# Altium footprint library PBL - SMD Packages.PcbLib: 263 footprints (part 5 of 17)
Each footprint in its own frame and in the unit in brackets; x right, y up, seen from the top. Pads: shape width x height; smd on the part's side, far side on the other; paste and mask are expansions set on the pad; w line width, h text height; cw(c..) or ccw(c..) is an arc to the next point about the centre after c.
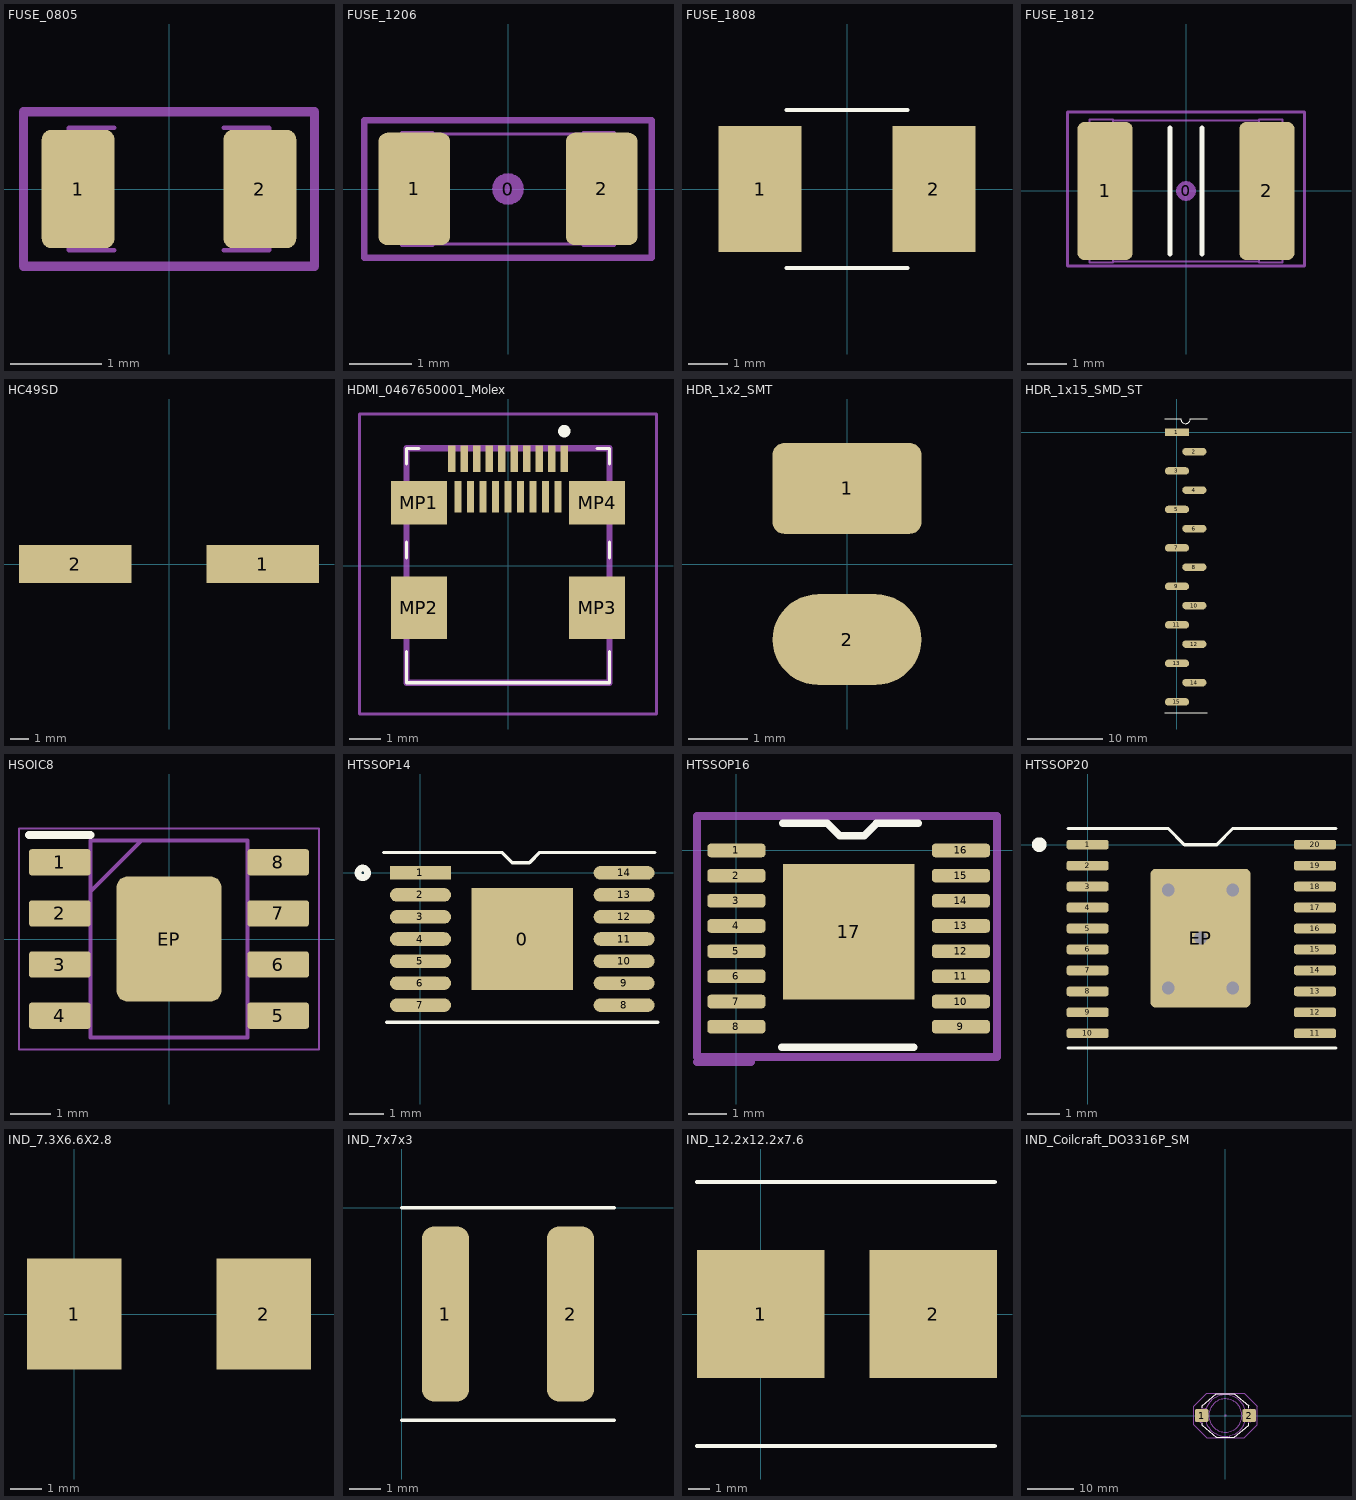
[diagram p4: the footprints below, top view; thin cyan lines are the x and y axes]

## FUSE_0805 [mm] "FUSE, Body 2.0x1.2mm, EIA 0805, IPC Medium Density"
height 0.7
pads (2):
  rrect25% 0.8x1.3 smd: 1(-1,0) 2(1,0)
13 - 3D Top Side:
  lines w0.05: -0.6,-0.675 -1.1,-0.675 -1.1,0.675 -0.6,0.675 ; 0.6,-0.675 1.1,-0.675 1.1,0.675 0.6,0.675
15 - Top Courtyards:
  lines w0.1: -1.6,-0.85 -1.6,0.85 1.6,0.85 1.6,-0.85 -1.6,-0.85

## FUSE_1206 [mm] "Fuse for 1206 package"
height 1
pads (3):
  round 0.508 on Mech15: 0(0,0)
  rrect25% 1.15x1.8 smd: 1(-1.5,0) 2(1.5,0)
13 - 3D Top Side:
  lines w0.05: -1.2,-0.88 1.2,-0.88 ; -1.2,0.88 1.2,0.88 ; -1.7,-0.9 -1.2,-0.9 -1.2,0.9 -1.7,0.9 -1.7,-0.9 ; 1.2,-0.9 1.7,-0.9 1.7,0.9 1.2,0.9 1.2,-0.9
15 - Top Courtyards:
  lines w0.1: -2.3,-1.1 -2.3,1.1 2.3,1.1 2.3,-1.1 -2.3,-1.1

## FUSE_1808 [mm]
pads (2):
  rect 2.1x3.2 smd: 1(-2.2,0) 2(2.2,0)
Top Overlay:
  lines w0.1: -1.53,-2 1.53,-2 ; -1.53,2 1.53,2
3D body "User Library-Fuse2.STEP": height 2.47, standoff -0.13, extent -3.05,-1.3 3.05,1.3

## FUSE_1812 [mm] "SMD Fuse 4.5x3.2mm, 1812"
height 2.8
pads (3):
  round 0.508 on Mech15: 0(0,0)
  rrect25% 1.4x3.5 smd: 1(-2.05,0) 2(2.05,0)
Top Overlay:
  lines w0.127: -0.4,-1.6 -0.4,1.6 ; 0.4,-1.6 0.4,1.6
13 - 3D Top Side:
  lines w0.05: -1.85,-1.791 1.85,-1.791 ; -1.85,1.791 1.85,1.791 ; -2.45,-1.811 -1.85,-1.811 -1.85,1.811 -2.45,1.811 -2.45,-1.811 ; 1.85,-1.811 1.85,1.811 2.45,1.811 2.45,-1.811 1.85,-1.811
15 - Top Courtyards:
  lines w0.076: -3,-1.9 3,-1.9 3,2 -3,2 -3,-1.9
3D body "User Library-Fuse 1812.step": height 1.03, standoff 0, extent -2.365,-1.74 2.37,1.74

## HC49SD [mm] "SMD scrystal"
pads (2):
  rect 6x2 smd: 1(5,0) 2(-5,0)

## HDMI_0467650001_Molex [mm] "hdmi connector SMD"
pads (23):
  rect 0.23x0.85 smd: 1(1.8,3.424) 3(1.4,3.424) 5(1,3.424) 7(0.6,3.424) 9(0.2,3.424) 11(-0.2,3.424) 13(-0.6,3.424) 15(-1,3.424) 17(-1.4,3.424) 19(-1.8,3.424)
  rect 0.23x1 smd: 2(1.6,2.199) 4(1.2,2.199) 6(0.8,2.199) 8(0.4,2.199) 10(0,2.199) 12(-0.4,2.199) 14(-0.8,2.199) 16(-1.2,2.199) 18(-1.6,2.199)
  rect 1.8x1.38 smd: MP1(-2.85,2.01) MP4(2.85,2.01)
  rect 1.8x2 smd: MP2(-2.85,-1.35) MP3(2.85,-1.35)
Top Overlay:
  lines w0.1: -3.25,-2.75 -3.25,-3.75 3.25,-3.75 3.25,-2.75 ; -3.25,0.25 -3.25,0.75 ; -3.25,3.25 -3.25,3.75 -2.85,3.75 ; 2.85,3.75 3.25,3.75 3.25,3.25 ; 3.25,0.25 3.25,0.75
  lines w0.2: 1.8,4.2 cw(c1.8,4.3) 1.8,4.4 cw(c1.8,4.3) 1.8,4.2
13 - 3D Top Side:
  lines w0.2: -3.25,-3.75 -3.25,3.75 3.25,3.75 3.25,-3.75 -3.25,-3.75
15 - Top Courtyards:
  lines w0.1: -4.75,-4.75 -4.75,4.849 4.75,4.849 4.75,-4.75 -4.75,-4.75
3D body "0467650001.stp": height 3, standoff 0, extent -3.612,-3.75 3.612,3.826

## HDR_1x2_SMT [mm]
pads (2):
  rrect25% 2.5x1.524 smd: 1(0,1.27)
  oval 2.5x1.524 smd: 2(0,-1.27)

## HDR_1x15_SMD_ST [mm]
pads (15):
  rect 3.2x1 smd: 1(0,0)
  oval 3.2x1 smd: 2(2.3,-2.54) 3(0,-5.08) 4(2.3,-7.62) 5(0,-10.16) 6(2.3,-12.7) 7(0,-15.24) 8(2.3,-17.78) 9(0,-20.32) 10(2.3,-22.86) 11(0,-25.4) 12(2.3,-27.94) 13(0,-30.48) 14(2.3,-33.02) 15(0,-35.56)
Top Overlay:
  lines w0.1: -1.604,1.799 0.511,1.799 ccw(c1.146,1.799) 1.781,1.799 3.996,1.799 ; -1.6,-37 4,-37

## HSOIC8 [mm] "SOIC 8 with EP"
pads (9):
  rrect20% 1.525x0.65 smd: 1(-2.712,1.905) 2(-2.712,0.635) 3(-2.712,-0.635) 4(-2.712,-1.905) 5(2.712,-1.905) 6(2.712,-0.635) 7(2.712,0.635) 8(2.712,1.905)
  rrect20% 2.6x3.1 smd: EP(0,0)
Top Overlay:
  lines w0.2: -3.475,2.58 -1.95,2.58
13 - 3D Top Side:
  lines w0.1: -1.95,1.18 -0.68,2.45 ; -1.95,-2.45 -1.95,2.45 1.95,2.45 1.95,-2.45 -1.95,-2.45
15 - Top Courtyards:
  lines w0.05: -3.725,-2.75 -3.725,2.75 3.725,2.75 3.725,-2.75 -3.725,-2.75
3D body "LMR33620BDDAR.stp": height 1.7, standoff 0, extent -3,-2.45 3,2.45

## HTSSOP14 [mm]
pads (15):
  rect 3x3 smd: 0(3,-1.95)
  rect 1.8x0.4 smd: 1(0,0)
  oval 1.8x0.4 smd: 2(0,-0.65) 3(0,-1.3) 4(0,-1.95) 5(0,-2.6) 6(0,-3.25) 7(0,-3.9) 8(6,-3.9) 9(6,-3.25) 10(6,-2.6) 11(6,-1.95) 12(6,-1.3) 13(6,-0.65) 14(6,0)
Top Overlay:
  circle w0.2: c-1.7,0 r0.141
  lines w0.1: -1.088,0.6 2.4,0.6 2.7,0.3 3.213,0.3 3.512,0.6 6.913,0.6 ; -1,-4.4 7,-4.4
3D body "Htssop14.step": height 1, standoff 0, extent -0.2,-4.45 6.2,0.55

## HTSSOP16 [mm]
pads (17):
  rrect50% 1.5x0.35 smd: 1(0,0) 2(0,-0.65) 3(0,-1.3) 4(0,-1.95) 5(0,-2.6) 6(0,-3.25) 7(0,-3.9) 8(0,-4.55) 9(5.8,-4.55) 10(5.8,-3.9) 11(5.8,-3.25) 12(5.8,-2.6) 13(5.8,-1.95) 14(5.8,-1.3) 15(5.8,-0.65) 16(5.8,0)
  rect 3.4x3.5 smd mask+0.102: 17(2.9,-2.1)
Top Overlay:
  lines w0.2: 1.172,-5.08 4.572,-5.08 ; 1.2,0.7 2.348,0.7 2.667,0.381 3.302,0.381 3.621,0.7 4.7,0.7
Mechanical 3:
  lines w0.2: -1.016,-5.461 0.381,-5.461 ; -1.016,-5.334 -1.016,0.889 6.731,0.889 6.731,-5.334 -1.016,-5.334
3D body "TSSOP16.stp": height 1.11, standoff 0.01, extent -0.315,-4.851 6.115,0.251

## HTSSOP20 [mm]
pads (21):
  rrect50% 1.3x0.3 smd: 1(0,0) 2(0,-0.65) 3(0,-1.3) 4(0,-1.95) 5(0,-2.6) 6(0,-3.25) 7(0,-3.9) 8(0,-4.55) 9(0,-5.2) 10(0,-5.85) 11(7.05,-5.85) 12(7.05,-5.2) 13(7.05,-4.55) 14(7.05,-3.9) 15(7.05,-3.25) 16(7.05,-2.6) 17(7.05,-1.95) 18(7.05,-1.3) 19(7.05,-0.65) 20(7.05,0)
  rrect10% 3.1x4.3 smd: EP(3.5,-2.9)
via 3.5,-2.9 diameter 0.7 hole 0.4
via 2.5,-1.4 diameter 0.7 hole 0.4
via 4.5,-1.4 diameter 0.7 hole 0.4
via 4.5,-4.45 diameter 0.7 hole 0.4
via 2.5,-4.45 diameter 0.7 hole 0.4
Top Overlay:
  circle w0.254: c-1.5,0 r0.1
  lines w0.1: -0.6,-6.3 7.7,-6.3 ; -0.6,0.5 2.5,0.5 3,0 4,0 ; 7.7,0.5 4.5,0.5 4,0 ; 4,0 4,0

## IND_7.3X6.6X2.8 [mm]
pads (2):
  rect 3x3.5 smd mask+0.102: 1(0,0) 2(6,0)

## IND_7x7x3 [mm] "7mm x 7mm x 2.8mm footprint for inductor"
pads (2):
  rrect50% 1.5x5.6 smd: 1(1.4,-3.4) 2(5.4,-3.4)
Top Overlay:
  lines w0.1: 0,-6.8 6.8,-6.8 ; 0,0 6.8,0
3D body: height 2.8, standoff 0.1, extent 0.2,-6.6 6.6,-0.2

## IND_12.2x12.2x7.6 [mm] "12.2x12.2x7.6 shield smd package for inductor"
pads (2):
  rect 6x6 smd mask+0.102: 1(0,0) 2(8.1,0)
Top Overlay:
  lines w0.2: -3,-6.2 11,-6.2 ; -3,6.2 11,6.2

## IND_Coilcraft_DO3316P_SM [mil] "Wire-wound Power Inductor, 2-Leads, Body 12.95x9.4mm"
height 205
pads (3):
  round 20 on Mech15: 0(0,0)
  rrect25% 115x110 smd: 1(-202.5,0) 2(202.5,0)
Top Overlay:
  lines w6: -200,-65 -200,-82.84 -76.63,-185 76.63,-185 200,-82.84 200,-65 ; -200,65 -200,82.84 -76.63,185 76.63,185 200,82.84 200,65
13 - 3D Top Side:
  drawing of 272 lines, arcs and shapes, not listed
15 - Top Courtyards:
  lines w3: -270,-80 -270,80 -160,190 160,190 270,80 270,-80 160,-190 -160,-190 -270,-80
3D body "Pulse Inductor RR.STEP": height 172.5, standoff 0, extent -255.38,-185 255.2,185